# Altium footprint library Phoenix.PcbLib: 54 footprints (part 1 of 4)
Each footprint in its own frame and in the unit in brackets; x right, y up, seen from the top. Pads: shape width x height; smd on the part's side, far side on the other; paste and mask are expansions set on the pad; w line width, h text height; cw(c..) or ccw(c..) is an arc to the next point about the centre after c.
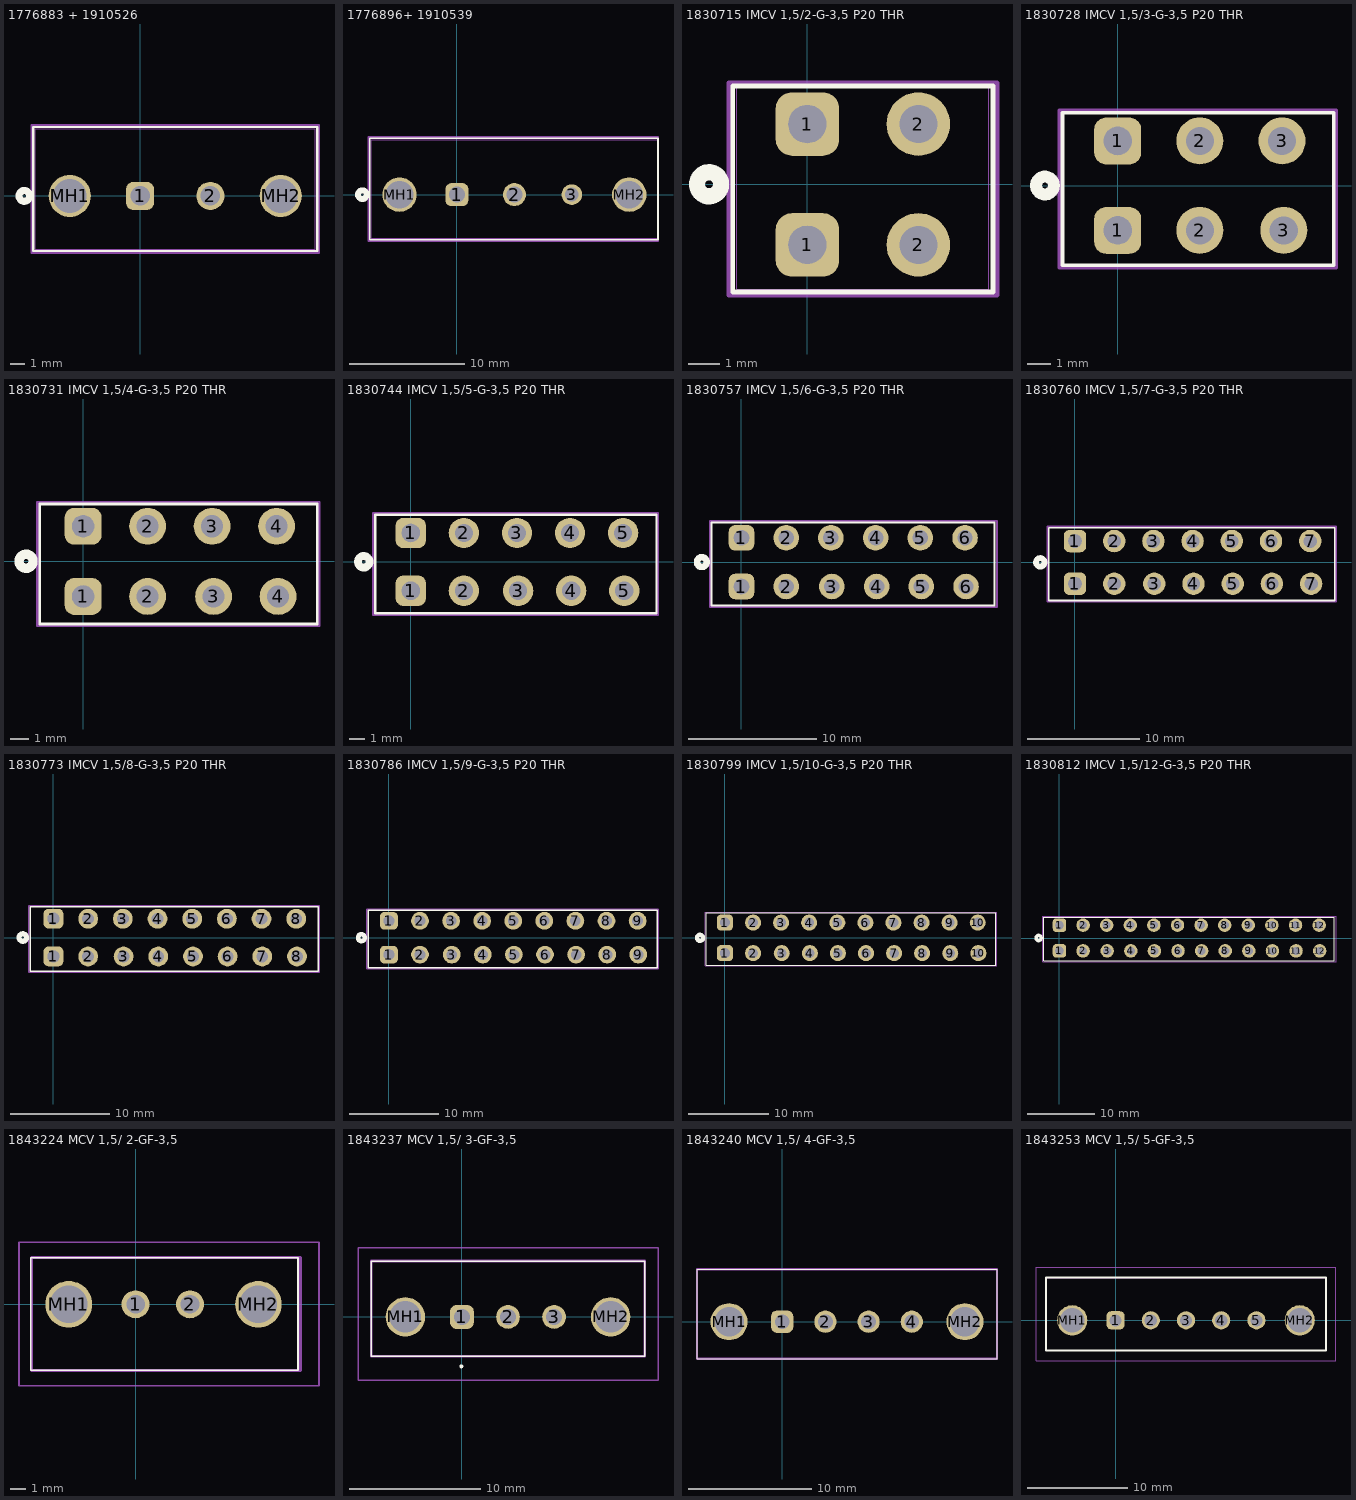
[diagram p0: the footprints below, top view; thin cyan lines are the x and y axes]

## 1776883 + 1910526 [mm]
pads (4):
  rrect50% 2x2 hole 1.4 paste-0.953 mask+0: 1(0,0)
  round 2 hole 1.4 paste-0.953 mask+0: 2(5,0)
  round 3 / inner round 2.921 / far side round 5 hole 2.4 paste-1.46 mask-1.46: MH1(-5,0) MH2(10,0)
Top Overlay:
  circle w0.508: c-8.232,0 r0.381
  lines w0.152: -7.597,-3.917 -7.597,4.897 12.596,4.897 12.596,-3.917 -7.597,-3.917
Bottom Overlay:
  circle w0.508: c-8.232,0 r0.381
Mechanical 13:
  lines w0.025: -7.47,-3.79 -7.47,4.77 12.469,4.77 12.469,-3.79 -7.47,-3.79
Mechanical 15:
  lines w0.152: -7.724,-4.044 12.723,-4.044 12.723,5.024 -7.724,5.024 -7.724,-4.044
3D body "Wuerth_5051022045_ISO_7049_Stahl_verzinkt_Linsenkopf_Z_Form_C.stp": height 2.9, standoff -3.2, extent 8,-2 12,2
3D body "Wuerth_5051022045_ISO_7049_Stahl_verzinkt_Linsenkopf_Z_Form_C.stp": height 2.9, standoff -3.2, extent -7,-2 -3,2
3D body "1910526.stp": height 38.3, standoff 12.7, extent -7.46,-3.951 12.54,11.049
3D body "1776883.stp": height 12, standoff -3.9, extent -7.46,-3.937 12.54,4.663

## 1776896+ 1910539 [mm]
pads (5):
  rrect50% 2x2 hole 1.4 paste-0.953 mask+0: 1(0,0)
  round 2 hole 1.4 paste-0.953 mask+0: 2(5,0)
  round 1.8 hole 1.2 unplated: 3(10,0)
  round 3 / inner round 2.921 / far side round 5 hole 2.4 paste-1.46 mask-1.46: MH1(-5,0) MH2(15,0)
Top Overlay:
  circle w0.508: c-8.232,0 r0.381
  lines w0.152: -7.597,-3.917 -7.597,4.897 17.5,4.897 17.5,-3.917 -7.597,-3.917
Bottom Overlay:
  circle w0.508: c-8.232,0 r0.381
Mechanical 13:
  lines w0.025: -7.47,-3.79 17.5,-3.79 17.5,4.77 -7.47,4.77 -7.47,-3.79
Mechanical 15:
  lines w0.152: -7.724,-4.044 -7.724,5.024 17.5,5.024 17.5,-4.044 -7.724,-4.044
3D body "1910539.stp": height 35.3, standoff 9.7, extent -7.5,-4 17.5,11
3D body "1776896.stp": height 12, standoff -3.9, extent -7.5,-3.75 17.5,4.85
3D body "Wuerth_5051022045_ISO_7049_Stahl_verzinkt_Linsenkopf_Z_Form_C.stp": height 2.9, standoff -3.2, extent 13,-2 17,2
3D body "Wuerth_5051022045_ISO_7049_Stahl_verzinkt_Linsenkopf_Z_Form_C.stp": height 2.9, standoff -3.2, extent -7,-2 -3,2

## 1830715 IMCV 1,5/2-G-3,5 P20 THR [mm]
pads (4):
  rrect50% 2x2 hole 1.2 paste-0.851: 1(0,-1.91) 1(0,1.9)
  round 2 hole 1.2 paste-0.851: 2(3.5,-1.91) 2(3.5,1.9)
Top Overlay:
  circle w0.508: c-3.1,0 r0.381
  lines w0.152: -2.352,-3.4 5.852,-3.4 5.852,3.1 -2.352,3.1 -2.352,-3.4
Mechanical 13:
  lines w0.025: -2.225,-3.302 5.725,-3.302 5.725,3.15 -2.225,3.15 -2.225,-3.302
Mechanical 15:
  lines w0.152: -2.479,-3.5 -2.479,3.204 5.979,3.204 5.979,-3.5 -2.479,-3.5
3D body "1830715.stp": height 14.6, standoff -1.8, extent -2.15,-3.3 5.65,3

## 1830728 IMCV 1,5/3-G-3,5 P20 THR [mm]
pads (6):
  rrect50% 2x2 hole 1.2 paste-0.851: 1(0,-1.91) 1(0,1.9)
  round 2 hole 1.2 paste-0.851: 2(3.5,-1.91) 2(3.5,1.9)
  round 2 hole 1.2 unplated: 3(7,1.9) 3(7.077,-1.91)
Top Overlay:
  circle w0.508: c-3.1,0 r0.381
  lines w0.152: -2.352,-3.4 -2.352,3.1 9.2,3.1 9.2,-3.4 -2.352,-3.4
Mechanical 15:
  lines w0.152: -2.479,-3.5 9.3,-3.5 9.3,3.204 -2.479,3.204 -2.479,-3.5
3D body "1830728.stp": height 14.6, standoff -1.8, extent -2.15,-3.3 9.15,3

## 1830731 IMCV 1,5/4-G-3,5 P20 THR [mm]
pads (8):
  rrect50% 2x2 hole 1.2 paste-0.851: 1(0,-1.91) 1(0,1.9)
  round 2 hole 1.2 paste-0.851: 2(3.5,-1.91) 2(3.5,1.9)
  round 2 hole 1.2 unplated: 3(7,1.9) 3(7.077,-1.91) 4(10.5,1.9) 4(10.577,-1.91)
Top Overlay:
  circle w0.508: c-3.1,0 r0.381
  lines w0.152: -2.352,-3.4 12.7,-3.4 12.7,3.1 -2.352,3.1 -2.352,-3.4
Mechanical 15:
  lines w0.152: -2.479,-3.5 -2.479,3.204 12.8,3.204 12.8,-3.5 -2.479,-3.5
3D body "1830731.stp": height 14.6, standoff -1.8, extent -2.15,-3.3 12.65,3

## 1830744 IMCV 1,5/5-G-3,5 P20 THR [mm]
pads (10):
  rrect50% 2x2 hole 1.2 paste-0.851: 1(0,-1.91) 1(0,1.9)
  round 2 hole 1.2 paste-0.851: 2(3.5,-1.91) 2(3.5,1.9)
  round 2 hole 1.2 unplated: 3(7,1.9) 3(7.077,-1.91) 4(10.5,1.9) 4(10.577,-1.91) 5(14,1.9) 5(14.077,-1.91)
Top Overlay:
  circle w0.508: c-3.1,0 r0.381
  lines w0.152: -2.352,-3.4 -2.352,3.1 16.2,3.1 16.2,-3.4 -2.352,-3.4
Mechanical 15:
  lines w0.152: -2.479,-3.5 16.3,-3.5 16.3,3.204 -2.479,3.204 -2.479,-3.5
3D body "1830744.stp": height 14.6, standoff -1.8, extent -2.15,-3.3 16.15,3

## 1830757 IMCV 1,5/6-G-3,5 P20 THR [mm]
pads (12):
  rrect50% 2x2 hole 1.2 paste-0.851: 1(0,-1.91) 1(0,1.9)
  round 2 hole 1.2 paste-0.851: 2(3.5,-1.91) 2(3.5,1.9)
  round 2 hole 1.2 unplated: 3(7,1.9) 3(7.077,-1.91) 4(10.5,1.9) 4(10.577,-1.91) 5(14,1.9) 5(14.077,-1.91) 6(17.5,1.9) 6(17.577,-1.91)
Top Overlay:
  circle w0.508: c-3.1,0 r0.381
  lines w0.152: -2.352,-3.4 19.8,-3.4 19.8,3.1 -2.352,3.1 -2.352,-3.4
Mechanical 15:
  lines w0.152: -2.479,-3.5 -2.479,3.204 20,3.204 20,-3.5 -2.479,-3.5
3D body "1830757.stp": height 14.6, standoff -1.8, extent -2.15,-3.3 19.65,3

## 1830760 IMCV 1,5/7-G-3,5 P20 THR [mm]
pads (14):
  rrect50% 2x2 hole 1.2 paste-0.851: 1(0,-1.91) 1(0,1.9)
  round 2 hole 1.2 paste-0.851: 2(3.5,-1.91) 2(3.5,1.9)
  round 2 hole 1.2 unplated: 3(7,1.9) 3(7.077,-1.91) 4(10.5,1.9) 4(10.577,-1.91) 5(14,1.9) 5(14.077,-1.91) 6(17.5,1.9) 6(17.577,-1.91) 7(21,1.9) 7(21.077,-1.91)
Top Overlay:
  circle w0.508: c-3.1,0 r0.381
  lines w0.152: -2.352,-3.4 23.2,-3.4 23.2,3.1 -2.352,3.1 -2.352,-3.4
Mechanical 15:
  lines w0.152: -2.479,-3.5 -2.479,3.204 23.3,3.204 23.3,-3.5 -2.479,-3.5
3D body "1830760.stp": height 14.6, standoff -1.8, extent -2.15,-3.3 23.15,3

## 1830773 IMCV 1,5/8-G-3,5 P20 THR [mm]
pads (16):
  rrect50% 2x2 hole 1.2 paste-0.851: 1(0,-1.91) 1(0,1.9)
  round 2 hole 1.2 paste-0.851: 2(3.5,-1.91) 2(3.5,1.9)
  round 2 hole 1.2 unplated: 3(7,1.9) 3(7.077,-1.91) 4(10.5,1.9) 4(10.577,-1.91) 5(14,1.9) 5(14.077,-1.91) 6(17.5,1.9) 6(17.577,-1.91) 7(21,1.9) 7(21.077,-1.91) 8(24.5,1.9) 8(24.577,-1.91)
Top Overlay:
  circle w0.508: c-3.1,0 r0.381
  lines w0.152: -2.352,-3.4 -2.352,3.1 26.7,3.1 26.7,-3.4 -2.352,-3.4
Mechanical 15:
  lines w0.152: -2.479,-3.5 26.8,-3.5 26.8,3.204 -2.479,3.204 -2.479,-3.5
3D body "1830773.stp": height 14.6, standoff -1.8, extent -2.15,-3.3 26.65,3

## 1830786 IMCV 1,5/9-G-3,5 P20 THR [mm]
pads (18):
  rrect50% 2x2 hole 1.2 paste-0.851: 1(0,-1.91) 1(0,1.9)
  round 2 hole 1.2 paste-0.851: 2(3.5,-1.91) 2(3.5,1.9)
  round 2 hole 1.2 unplated: 3(7,1.9) 3(7.077,-1.91) 4(10.5,1.9) 4(10.577,-1.91) 5(14,1.9) 5(14.077,-1.91) 6(17.5,1.9) 6(17.577,-1.91) 7(21,1.9) 7(21.077,-1.91) 8(24.5,1.9) 8(24.577,-1.91) 9(28,1.9) 9(28.077,-1.91)
Top Overlay:
  circle w0.508: c-3.1,0 r0.381
  lines w0.152: -2.352,-3.4 -2.352,3.1 30.2,3.1 30.2,-3.4 -2.352,-3.4
Mechanical 15:
  lines w0.152: -2.479,-3.5 30.3,-3.5 30.3,3.204 -2.479,3.204 -2.479,-3.5
3D body "1830786.stp": height 14.6, standoff -1.8, extent -2.15,-3.3 30.15,3

## 1830799 IMCV 1,5/10-G-3,5 P20 THR [mm]
pads (20):
  rrect50% 2x2 hole 1.2 paste-0.851: 1(0,-1.91) 1(0,1.9)
  round 2 hole 1.2 paste-0.851: 2(3.5,-1.91) 2(3.5,1.9)
  round 2 hole 1.2 unplated: 3(7,1.9) 3(7.077,-1.91) 4(10.5,1.9) 4(10.577,-1.91) 5(14,1.9) 5(14.077,-1.91) 6(17.5,1.9) 6(17.577,-1.91) 7(21,1.9) 7(21.077,-1.91) 8(24.5,1.9) 8(24.577,-1.91) 9(28,1.9) 9(28.077,-1.91) 10(31.5,1.9) 10(31.577,-1.91)
Top Overlay:
  circle w0.508: c-3.1,0 r0.381
  lines w0.152: -2.352,-3.4 -2.352,3.1 33.75,3.1 33.75,-3.4 -2.352,-3.4
Mechanical 15:
  lines w0.152: -2.479,-3.5 33.9,-3.5 33.9,3.204 -2.479,3.204 -2.479,-3.5
3D body "1830799.stp": height 14.6, standoff -1.8, extent -2.15,-3.3 33.65,3

## 1830812 IMCV 1,5/12-G-3,5 P20 THR [mm]
pads (24):
  rrect50% 2x2 hole 1.2 paste-0.851: 1(0,-1.91) 1(0,1.9)
  round 2 hole 1.2 paste-0.851: 2(3.5,-1.91) 2(3.5,1.9)
  round 2 hole 1.2 unplated: 3(7,1.9) 3(7.077,-1.91) 4(10.5,1.9) 4(10.577,-1.91) 5(14,1.9) 5(14.077,-1.91) 6(17.5,1.9) 6(17.577,-1.91) 7(21,1.9) 7(21.077,-1.91) 8(24.5,1.9) 8(24.577,-1.91) 9(28,1.9) 9(28.077,-1.91) 10(31.5,1.9) 10(31.577,-1.91) 11(35,1.9) 11(35.077,-1.91) 12(38.5,1.9) 12(38.577,-1.91)
Top Overlay:
  circle w0.508: c-3.1,0 r0.381
  lines w0.152: -2.352,-3.4 -2.352,3.1 40.75,3.1 40.75,-3.4 -2.352,-3.4
Mechanical 15:
  lines w0.152: -2.479,-3.5 41,-3.5 41,3.204 -2.479,3.204 -2.479,-3.5
3D body "1830812.stp": height 14.6, standoff -1.8, extent -2.15,-3.3 40.65,3

## 1843224 MCV 1,5/ 2-GF-3,5 [mm]
pads (4):
  round 1.8 hole 1.2: 1(0,0) 2(3.5,0)
  round 3 / inner round 3.6 / far side round 5 hole 2.4: MH1(-4.3,0) MH2(7.9,0)
Top Overlay:
  lines w0.1: -6.75,-4.25 -6.75,3 10.45,3 10.45,-4.25 -6.75,-4.25
Mechanical 13:
  lines w0.2: -6.7,-4.25 -6.7,3 10.6,3 10.6,-4.25 -6.7,-4.25
Mechanical 15:
  lines w0.1: -7.5,-5.25 -7.5,4 11.8,4 11.8,-5.25 -7.5,-5.25
3D body "1940091.stp": height 32.2, standoff 11.4, extent -6.8,-5.8 10.5,6.6
3D body "1843224.stp": height 9.2, standoff -3.4, extent -6.85,-4.2 10.45,3.05
3D body "Wuerth_5051022045_ISO_7049_Stahl_verzinkt_Linsenkopf_Z_Form_C.stp": height 2.9, standoff -3.2, extent -6.3,-2 -2.3,2
3D body "Wuerth_5051022045_ISO_7049_Stahl_verzinkt_Linsenkopf_Z_Form_C.stp": height 2.9, standoff -3.2, extent 5.9,-2 9.9,2

## 1843237 MCV 1,5/ 3-GF-3,5 [mm]
pads (5):
  rrect50% 1.8x1.8 hole 1.2: 1(0,0)
  round 1.8 hole 1.2: 2(3.5,0) 3(7,0)
  round 3 / inner round 3.6 / far side round 5 hole 2.4: MH1(-4.3,0) MH2(11.3,0)
Top Overlay:
  lines w0.1: -6.9,-3 -6.9,4.25 13.9,4.25 13.9,-3 -6.9,-3
  lines w0.2: -0.1,-3.75 ccw(c-0.05,-3.75) 0,-3.75 ; -0.1,-3.75 cw(c-0.05,-3.75) 0,-3.75 ; -0.1,-3.75 ccw(c-0.05,-3.75) 0,-3.75
Mechanical 13:
  lines w0.2: -6.9,-3 -6.9,4.25 13.9,4.25 13.9,-3 -6.9,-3
Mechanical 15:
  lines w0.1: -7.9,-4.8 -7.9,5.25 14.9,5.25 14.9,-4.8 -7.9,-4.8
3D body "1940101.stp": height 32.2, standoff 11.4, extent -7,-7 13.8,5.4
3D body "1843237.stp": height 9.75, standoff -2.85, extent -6.9,-3.4 13.9,3.85
3D body "Wuerth_5051022045_ISO_7049_Stahl_verzinkt_Linsenkopf_Z_Form_C.stp": height 2.9, standoff -3.2, extent -6.3,-2 -2.3,2
3D body "Wuerth_5051022045_ISO_7049_Stahl_verzinkt_Linsenkopf_Z_Form_C.stp": height 2.9, standoff -3.2, extent 9.3,-2 13.3,2

## 1843240 MCV 1,5/ 4-GF-3,5 [mm]
pads (6):
  rrect50% 1.8x1.8 hole 1.2: 1(0,0)
  round 1.8 hole 1.2: 2(3.5,0) 3(7,0) 4(10.5,0)
  round 3 / inner round 3.6 / far side round 5 hole 2.4: MH1(-4.3,0) MH2(14.8,0)
Top Overlay:
  lines w0.1: -6.9,-3 -6.9,4.25 17.4,4.25 17.4,-3 -6.9,-3
Mechanical 13:
  lines w0.2: -6.9,-3 -6.9,4.25 17.4,4.25 17.4,-3 -6.9,-3
3D body "1940114.stp": height 32.2, standoff 11.4, extent -6.85,-6.5 17.45,5.9
3D body "1843240.stp": height 9.6, standoff -3, extent -6.97,-2.94 17.33,4.31
3D body "Wuerth_5051022045_ISO_7049_Stahl_verzinkt_Linsenkopf_Z_Form_C.stp": height 2.9, standoff -3.2, extent -6.3,-2 -2.3,2
3D body "Wuerth_5051022045_ISO_7049_Stahl_verzinkt_Linsenkopf_Z_Form_C.stp": height 2.9, standoff -3.2, extent 12.8,-2 16.8,2

## 1843253 MCV 1,5/ 5-GF-3,5 [mm]
pads (7):
  rrect50% 1.8x1.8 hole 1.2: 1(0,0)
  round 1.8 hole 1.2: 2(3.5,0) 3(7,0) 4(10.5,0) 5(14,0)
  round 3 / inner round 3.6 / far side round 5 hole 2.4: MH1(-4.3,0) MH2(18.3,0)
Top Overlay:
  lines w0.2: -6.9,-3 20.9,-3 20.9,4.25 -6.9,4.25 -6.9,-3
Mechanical 13:
  lines w0.1: -6.9,-3 20.9,-3 20.9,4.25 -6.9,4.25 -6.9,-3
Mechanical 15:
  lines w0.1: -7.9,-4 21.9,-4 21.9,5.25 -7.9,5.25 -7.9,-4
3D body "Wuerth_5051022045_ISO_7049_Stahl_verzinkt_Linsenkopf_Z_Form_C.stp": height 2.9, standoff -3.2, extent 16.3,-2 20.3,2
3D body "Wuerth_5051022045_ISO_7049_Stahl_verzinkt_Linsenkopf_Z_Form_C.stp": height 2.9, standoff -3.2, extent -6.3,-2 -2.3,2
3D body "1940127.stp": height 32.2, standoff 11.18, extent -6.8,-6.515 21,6.246
3D body "1843253.stp": height 9.68, standoff -2.92, extent -6.9,-3 20.9,4.25